# Altium footprint library 隔离ACDC电源模块.PcbLib: 2 footprints
Each footprint in its own frame and in the unit in brackets; x right, y up, seen from the top. Pads: shape width x height; smd on the part's side, far side on the other; paste and mask are expansions set on the pad; w line width, h text height; cw(c..) or ccw(c..) is an arc to the next point about the centre after c.
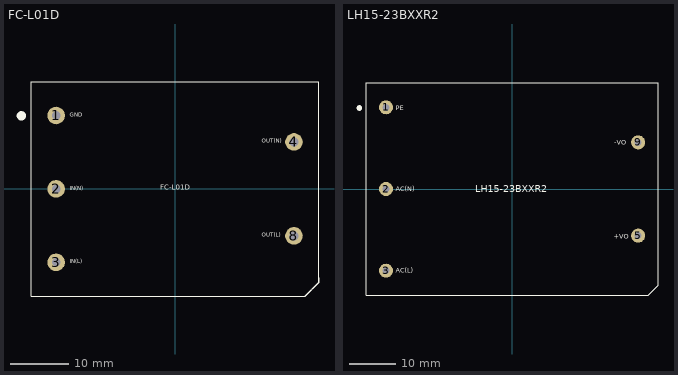
[diagram p0: the footprints below, top view; thin cyan lines are the x and y axes]

## FC-L01D [mm]
height 6
pads (5):
  round 3 hole 1.5: 1(-20.25,12.5) 2(-20.25,0) 3(-20.25,-12.5) 4(20.25,8) 8(20.25,-8)
Top Overlay:
  circle w0.8: c-26.181,12.446 r0.4
  lines w0.152: 22.098,-18.288 24.511,-15.875 ; 24.511,-15.875 24.511,-15.113 24.511,-15.875
  lines w0.2: -24.5,-18.25 22.136,-18.25 24.5,-15.886 24.5,18.25 -24.5,18.25 -24.5,-18.25
  text "OUT(N)" at 14.732,7.62 h1.2
  text "IN(N)" at -17.908,-0.508 h1.2
  text "IN(L)" at -17.908,-12.954 h1.2
  text "OUT(L)" at 14.732,-8.382 h1.2
  text "FC-L01D" at -2.54,-0.508 h1.5
  text "GND" at -17.907,12.065 h1.2
3D body "FC-L01D.stp": height 20.5, standoff -6, extent -24.25,-18 24.25,18

## LH15-23BXXR2 [mm]
pads (5):
  round 3 hole 1.5: 1(-27,17.5) 2(-27,0) 3(-27,-17.5) 5(27,-10) 9(27,10)
Top Overlay:
  circle w0.6: c-32.7,17.35 r0.3
  lines w0.127: -31.25,-22.75 29.15,-22.75 31.25,-20.65 31.25,22.75 -31.25,22.75 -31.25,-22.75
  text "-VO" at 21.875,9.525 h1.02
  text "+VO" at 21.75,-10.675 h1.02
  text "AC(N)" at -24.9,-0.45 h1.02
  text "AC(L)" at -24.9,-17.925 h1.02
  text "LH15-23BXXR2" at -7.875,-0.65 h1.5
  text "PE" at -24.9,16.85 h1.02
3D body "U1.step": height 22.51, standoff -5, extent -30.948,-22.447 31.052,22.553